# Altium footprint library PIF_PCB_Lib.PcbLib: 112 footprints (part 5 of 7)
Each footprint in its own frame and in the unit in brackets; x right, y up, seen from the top. Pads: shape width x height; smd on the part's side, far side on the other; paste and mask are expansions set on the pad; w line width, h text height; cw(c..) or ccw(c..) is an arc to the next point about the centre after c.
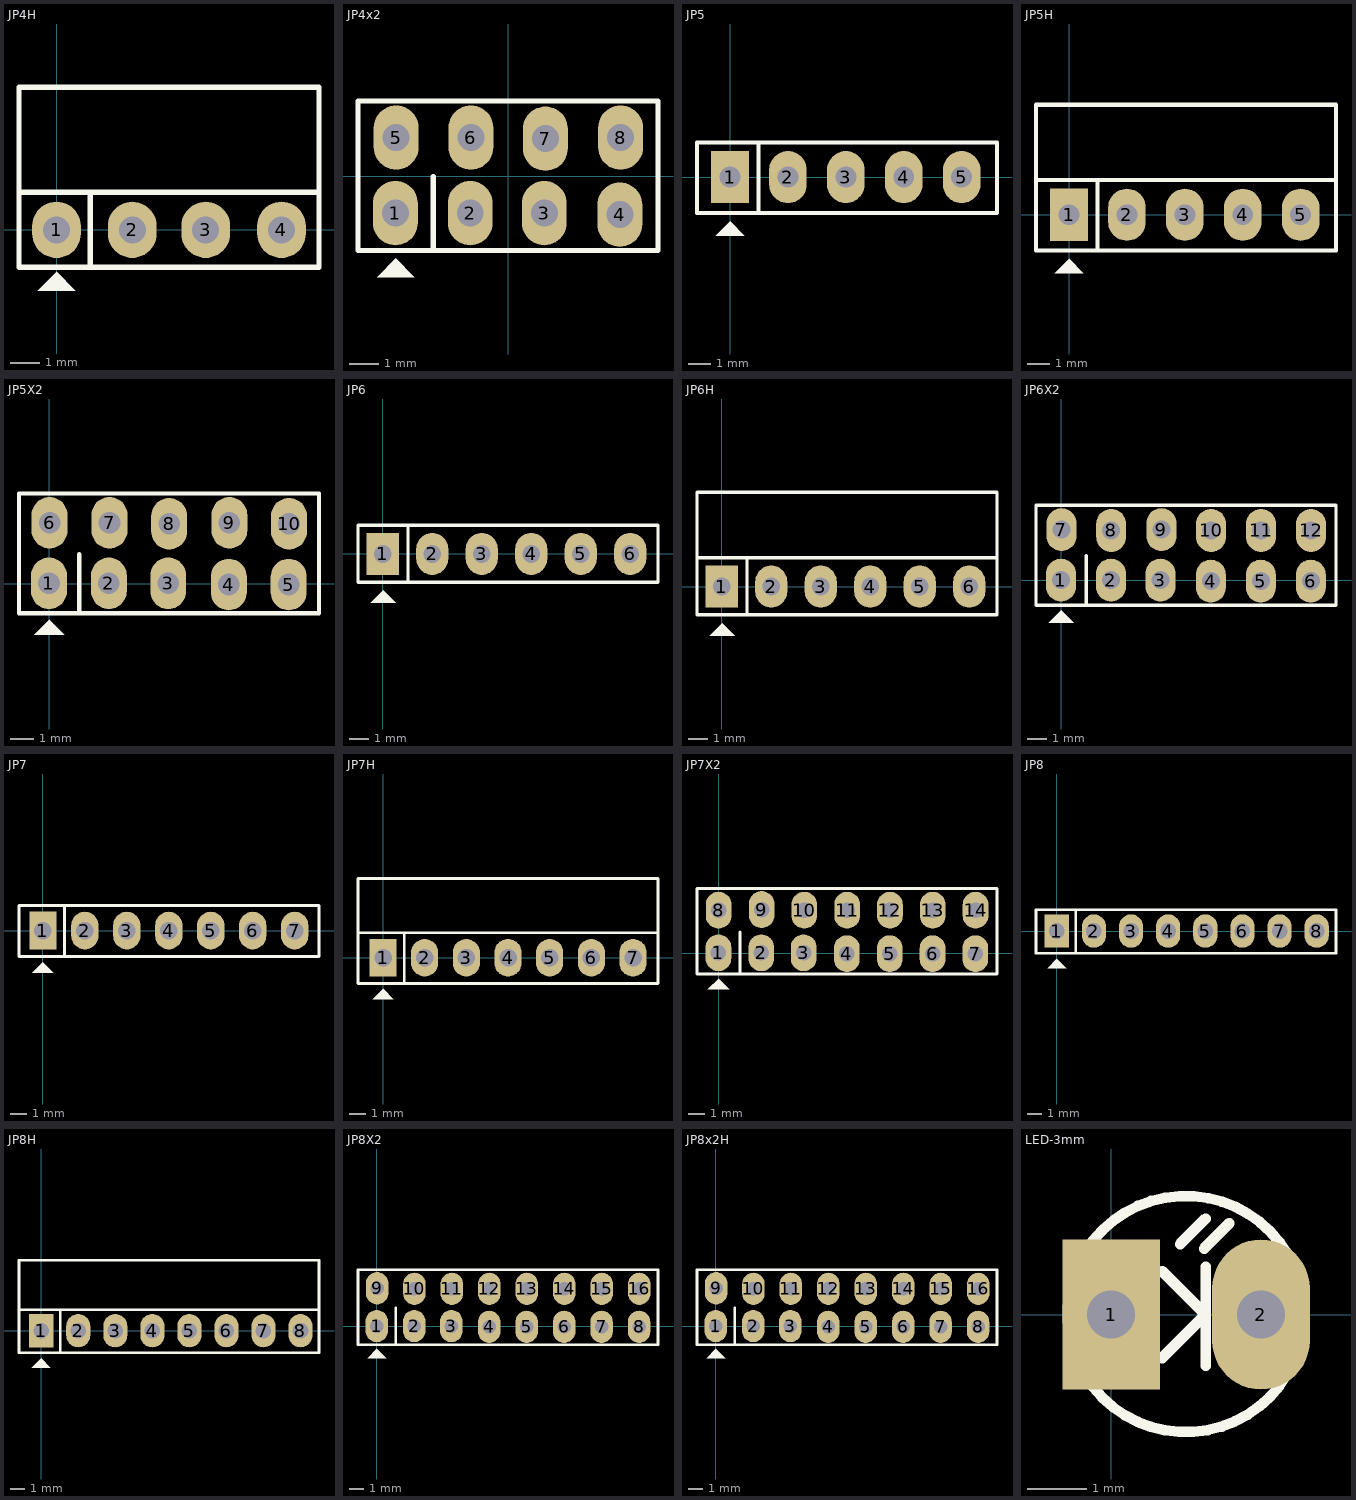
[diagram p4: the footprints below, top view; thin cyan lines are the x and y axes]

## JP4H [mil]
pads (4):
  oval 65x75 hole 36: 1(0,0) 2(101,0) 3(199,0) 4(300,0)
Top Overlay:
  region: 0,-56 -25,-81 25,-81
  lines w7: 45,-50 45,49 ; -50,50 -50,190 350,190 350,50 ; -50,50 -50,-50 350,-50 350,50 ; -50,50 350,50
3D body "JP4H.stp": height 99.03, standoff -93.89, extent -46.06,-14.96 346.07,423.63

## JP4x2 [mil] "Connector 4x2"
height 200
pads (8):
  oval 60x86 hole 36: 1(-150.5,-49.5) 2(-50.5,-49.5) 3(48.5,-49.5) 4(149.5,-51.5) 5(-149.5,51.5) 6(-49.5,51.5) 7(50,50) 8(150.5,51.5)
Top Overlay:
  region: -150,-110 -175,-135 -125,-135
  lines w7: -100,-99 -100,-1 ; -200.5,-99.5 200.5,-99.5 200.5,100.5 -200.5,100.5 -200.5,0.5 -200.5,-99.5
3D body "JP2-4.stp": height 335.25, standoff -117.51, extent -196.99,-99.99 203.01,100.01

## JP5 [mil] "JP5"
height 200
pads (5):
  rect 65x90 hole 36: 1(0,0)
  oval 65x90 hole 36: 2(100,0) 3(200,0) 4(300,0) 5(400,0)
Top Overlay:
  region: 0,-76 -25,-101 25,-101
  lines w7: 49,-60 49,58 ; -57,-62 -57,60 461,60 461,-62 -57,-62
3D body "JP1-5.stp": height 323.43, standoff -117.51, extent -48.03,-53.43 448.03,45

## JP5H [mil]
pads (5):
  rect 65x90 hole 36: 1(0,0)
  oval 65x90 hole 36: 2(100,0) 3(200,0) 4(300,0) 5(400,0)
Top Overlay:
  region: 0,-76 -25,-101 25,-101
  lines w7: 49,-60 49,58 ; -57,60 -57,190 461,190 461,60 ; -57,60 461,60 ; -57,60 -57,-62 461,-62 461,60
3D body "JP5H.stp": height 99.03, standoff -93.89, extent -46.06,-14.96 446.07,423.63

## JP5X2 [mil]
pads (10):
  oval 60x86 hole 36: 1(-0.5,0.5) 2(99.5,0.5) 3(198.5,0.5) 4(299.5,-1.5) 5(399.5,-1.5) 6(0.5,101.5) 7(100.5,101.5) 8(200,100) 9(300.5,101.5) 10(400,100)
Top Overlay:
  region: 0,-60 -25,-85 25,-85
  lines w7: 50,-49 50,49 ; -50.5,-49.5 -50.5,50.5 -50.5,150.5 450,150.5 450,-49.5 -50.5,-49.5
3D body "JP5X2.stp": height 335.25, standoff -117.51, extent -49.99,-49.99 450.01,150.01

## JP6 [mil] "JP6"
height 200
pads (6):
  rect 65x85 hole 36: 1(0,0)
  oval 65x85 hole 36: 2(100,0) 3(200,0) 4(300,0) 5(400,0) 6(500,0)
Top Overlay:
  region: 1,-74 -24,-99 26,-99
  lines w7: 51,-57 51,56 ; -50,-57 556,-57 556,58 -50,58 -50,-57
3D body "JP1-6.stp": height 323.43, standoff -117.51, extent -48.03,-50 548.03,48.43

## JP6H [mil]
pads (6):
  rect 65x85 hole 36: 1(0,0)
  oval 65x85 hole 36: 2(100,0) 3(200,0) 4(300,0) 5(400,0) 6(500,0)
Top Overlay:
  region: 1,-74 -24,-99 26,-99
  lines w7: 51,-57 51,56 ; -50,58 -50,190 556,190 556,58 ; -50,58 556,58 ; -50,58 -50,-57 556,-57 556,58
3D body "JP6H.stp": height 99.03, standoff -93.89, extent -46.06,-14.96 546.07,423.63

## JP6X2 [mil]
pads (12):
  oval 60x86 hole 36: 1(-0.5,0.5) 2(99.5,0.5) 3(198.5,0.5) 4(299.5,-1.5) 5(399.5,-1.5) 6(499.5,-1.5) 7(0.5,101.5) 8(100,100) 9(200.5,101.5) 10(300,100) 11(400,100) 12(500,100)
Top Overlay:
  region: 0,-60 -25,-85 25,-85
  lines w7: 50,-49 50,49 ; -50.5,-49.5 550,-49.5 550,150.5 -50.5,150.5 -50.5,50.5 -50.5,-49.5
3D body "JP6X2.stp": height 335.24, standoff -117.51, extent -49.99,-49.99 550.01,150.01

## JP7 [mil] "JP7"
height 200
pads (7):
  rect 65x90 hole 42: 1(0,0)
  oval 65x90 hole 42: 2(100,0) 3(200,0) 4(300,0) 5(400,0) 6(500,0) 7(600,0)
Top Overlay:
  region: 0,-75 -25,-100 25,-100
  lines w7: 51,-58 51,60 ; -57,-62 658,-62 658,60 -57,60 -57,-62
3D body "JP1-7.stp": height 323.44, standoff -117.51, extent -50,-49.21 646.06,49.21

## JP7H [mil]
pads (7):
  rect 65x90 hole 42: 1(0,0)
  oval 65x90 hole 42: 2(100,0) 3(200,0) 4(300,0) 5(400,0) 6(500,0) 7(600,0)
Top Overlay:
  region: 0,-75 -25,-100 25,-100
  lines w7: -57,60 660,60 ; -50,60 -60,60 ; 51,-58 51,60 ; -60,60 -60,-62 660,-62 660,60 ; -60,60 -60,190 660,190 660,60
3D body "JP7H.stp": height 99.03, standoff -93.89, extent -46.06,-24.96 646.07,413.63

## JP7X2 [mil]
pads (14):
  oval 60x86 hole 36: 1(-0.5,0.5) 2(99.5,0.5) 3(198.5,0.5) 4(299.5,-1.5) 5(399.5,-1.5) 6(499.5,-1.5) 7(599.5,-1.5) 8(0,100) 9(100.5,101.5) 10(200,100) 11(300,100) 12(400,100) 13(500,100) 14(600,100)
Top Overlay:
  region: 0,-60 -25,-85 25,-85
  lines w7: 50,-49 50,49 ; -50.5,-49.5 650,-49.5 650,150.5 -50.5,150.5 -50.5,50.5 -50.5,-49.5
3D body "JP7X2.stp": height 335.25, standoff -117.51, extent -49.99,-49.99 650.01,150.01

## JP8 [mil] "JP8"
height 200
pads (8):
  rect 65x90 hole 42: 1(0,0)
  oval 65x90 hole 42: 2(100,0) 3(200,0) 4(300,0) 5(400,0) 6(500,0) 7(600,0) 8(700,0)
Top Overlay:
  region: 0,-75 -25,-100 25,-100
  lines w7: 51,-60 51,56 ; -56,-60 -56,57 752,57 752,-60 -56,-60
3D body "JP1-8.stp": height 323.43, standoff -117.51, extent -48.03,-50 748.03,48.43

## JP8H [mil]
pads (8):
  rect 65x90 hole 42: 1(0,0)
  oval 65x90 hole 42: 2(100,0) 3(200,0) 4(300,0) 5(400,0) 6(500,0) 7(600,0) 8(700,0)
Top Overlay:
  region: 0,-75 -25,-100 25,-100
  lines w7: 51,-60 51,56 ; -60,57 -60,-60 750,-60 750,57 ; -60,57 750,57 ; -60,57 -60,190 750,190 750,57
3D body "JP8H.stp": height 49.21, standoff -143.7, extent -46.06,-14.96 746.06,423.62

## JP8X2 [mil]
pads (16):
  oval 60x86 hole 36: 1(-0.5,0.5) 2(99.5,0.5) 3(198.5,0.5) 4(299.5,-1.5) 5(399.5,-1.5) 6(499.5,-1.5) 7(599.5,-1.5) 8(699.5,-1.5) 9(0.5,101.5) 10(100,100) 11(200,100) 12(300,100) 13(400,100) 14(500,100) 15(600,100) 16(700,100)
Top Overlay:
  region: 0,-60 -25,-85 25,-85
  lines w7: 50,-49 50,49 ; -50.5,-49.5 750,-49.5 750,150.5 -50.5,150.5 -50.5,50.5 -50.5,-49.5
3D body "JP8X2.stp": height 335.25, standoff -117.51, extent -49.99,-49.99 750.01,150.01

## JP8x2H [mil]
pads (16):
  oval 60x86 hole 36: 1(0,0) 2(100,0) 3(199,0) 4(300,-2) 5(400,-2) 6(500,-2) 7(600,-2) 8(700,-2) 9(1,101) 10(100.5,99.5) 11(200.5,99.5) 12(300.5,99.5) 13(400.5,99.5) 14(500.5,99.5) 15(600.5,99.5) 16(700.5,99.5)
Top Overlay:
  region: 0.5,-60.5 -24.5,-85.5 25.5,-85.5
  lines w7: 50.5,-49.5 50.5,48.5 ; -50,-50 750.5,-50 750.5,150 -50,150 -50,50 -50,-50
3D body "pin_header_awl254-da-g16d.stp": height 197.45, standoff -117.51, extent -50,-13.44 750,493.65

## LED-3mm [mil] "LED 2 PIN, 3ly Only colour"
height 300
pads (2):
  rect 65x100 hole 32: 1(0,0)
  oval 65x100 hole 32: 2(100,0)
Top Overlay:
  lines w7: 34,-29 63,0 34,29 ; 46,47 63,64 ; 62,44 79,61 ; 63,-34 63,32 ; 117.92,-39.35 117.92,39.84
  lines w7.01: 117.57,-39.74 cw(c49.8,0.35) 117.72,40.19
3D body "SW3DPS-LED DIP 3MM-DEFAULT.STEP": height 217.14, standoff -117.51, extent -24.8,-74.81 112.99,74.8